# Altium footprint library etherceptor.PcbLib: 98 footprints (part 3 of 7)
Each footprint in its own frame and in the unit in brackets; x right, y up, seen from the top. Pads: shape width x height; smd on the part's side, far side on the other; paste and mask are expansions set on the pad; w line width, h text height; cw(c..) or ccw(c..) is an arc to the next point about the centre after c.
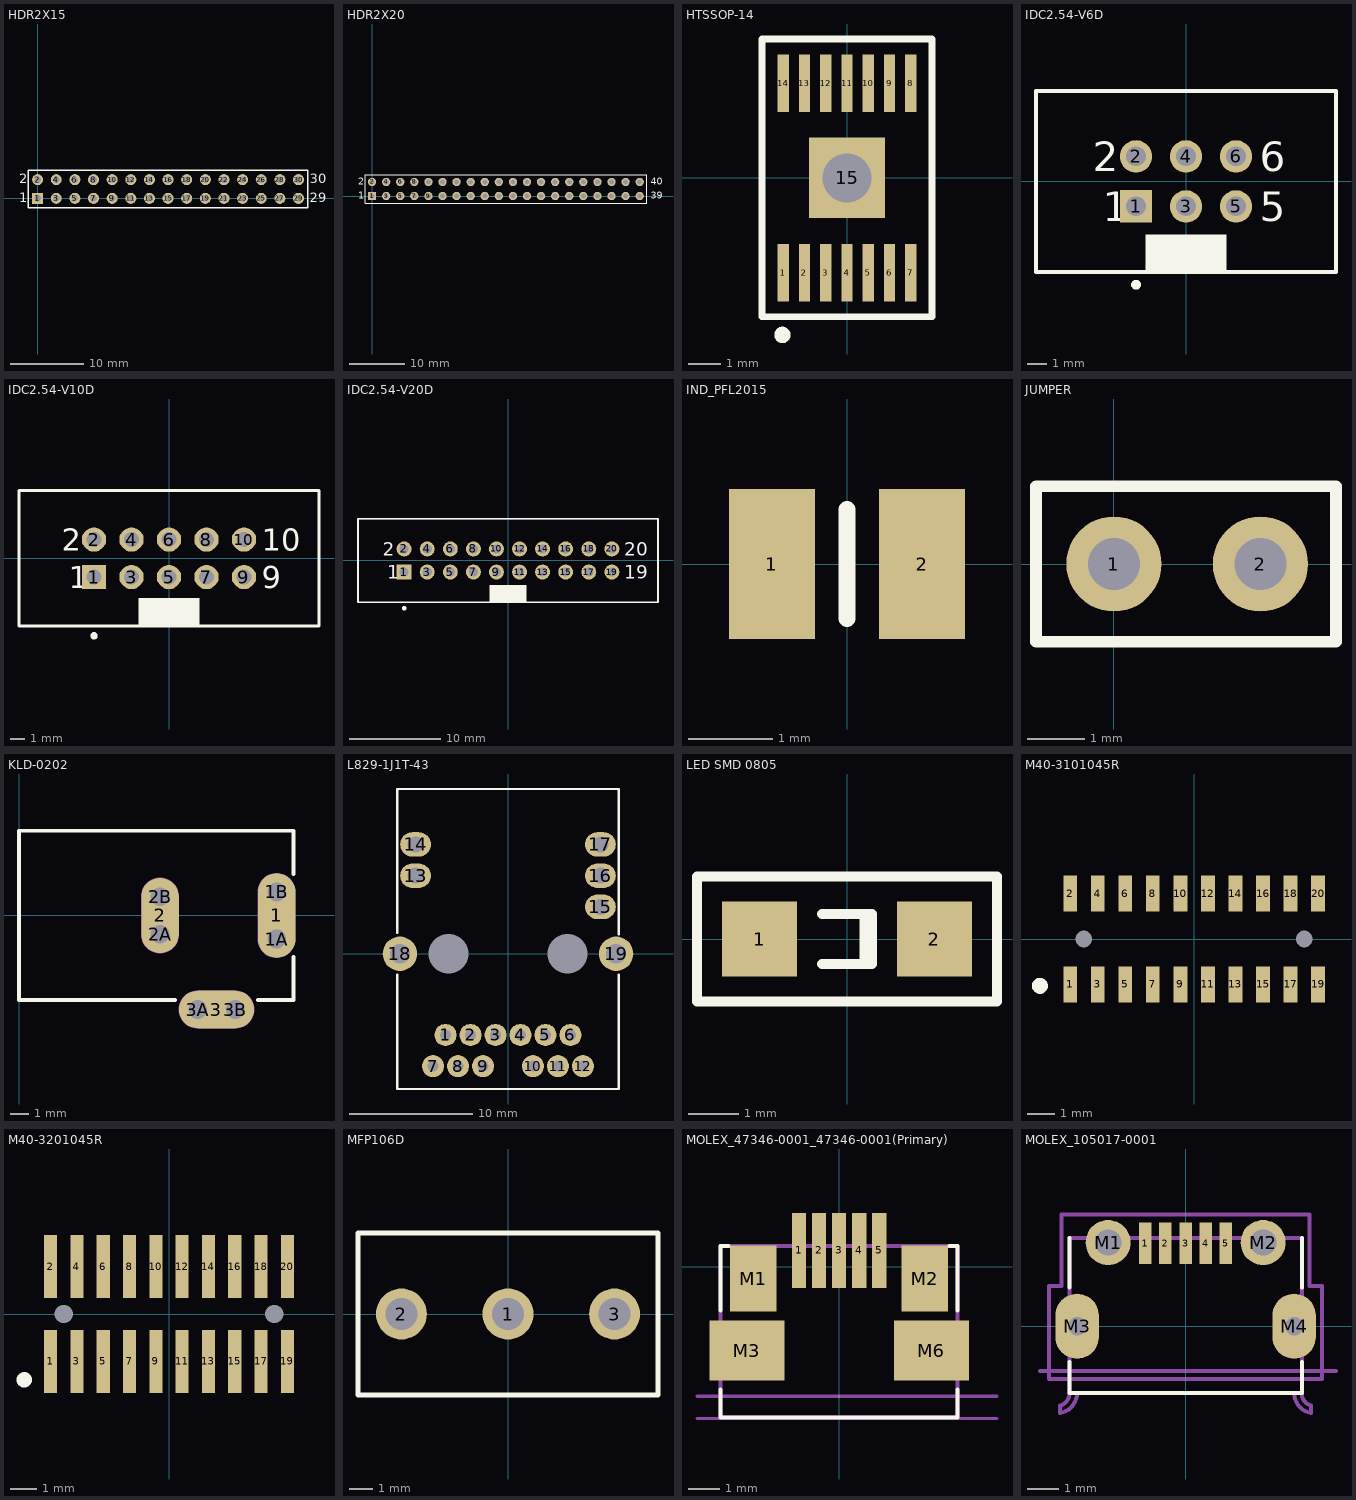
[diagram p2: the footprints below, top view; thin cyan lines are the x and y axes]

## HDR2X15 [mm] "Connector; Header; 15x2 Position"
pads (30):
  rect 1.5x1.5 hole 0.9: 1(0,0)
  round 1.5 hole 0.9: 2(0,2.54) 3(2.54,0) 4(2.54,2.54) 5(5.08,0) 6(5.08,2.54) 7(7.62,0) 8(7.62,2.54) 9(10.16,0) 10(10.16,2.54) 11(12.7,0) 12(12.7,2.54) 13(15.24,0) 14(15.24,2.54) 15(17.78,0) 16(17.78,2.54) 17(20.32,0) 18(20.32,2.54) 19(22.86,0) 20(22.86,2.54) 21(25.4,0) 22(25.4,2.54) 23(27.94,0) 24(27.94,2.54) 25(30.48,0) 26(30.48,2.54) 27(33.02,0) 28(33.02,2.54) 29(35.56,0) 30(35.56,2.54)
Top Overlay:
  lines w0.2: -1.27,-1.27 36.83,-1.27 36.83,3.81 -1.27,3.81 -1.27,-1.27
  text "1" at -2.54,-0.508 h1.27
  text "2" at -2.54,2.032 h1.27
  text "29" at 37.084,-0.508 h1.27
  text "30" at 37.084,2.032 h1.27

## HDR2X20 [mm] "Connector; Header; 20x2 Position"
pads (40):
  rect 1.5x1.5 hole 0.9: 1(0,0)
  round 1.5 hole 0.9: 2(0,2.54) 3(2.54,0) 4(2.54,2.54) 5(5.08,0) 6(5.08,2.54) 7(7.62,0) 8(7.62,2.54) 9(10.16,0) 10(10.16,2.54) 11(12.7,0) 12(12.7,2.54) 13(15.24,0) 14(15.24,2.54) 15(17.78,0) 16(17.78,2.54) 17(20.32,0) 18(20.32,2.54) 19(22.86,0) 20(22.86,2.54) 21(25.4,0) 22(25.4,2.54) 23(27.94,0) 24(27.94,2.54) 25(30.48,0) 26(30.48,2.54) 27(33.02,0) 28(33.02,2.54) 29(35.56,0) 30(35.56,2.54) 31(38.1,0) 32(38.1,2.54) 33(40.64,0) 34(40.64,2.54) 35(43.18,0) 36(43.18,2.54) 37(45.72,0) 38(45.72,2.54) 39(48.26,0) 40(48.26,2.54)
Top Overlay:
  lines w0.2: -1.27,-1.27 49.53,-1.27 49.53,3.81 -1.27,3.81 -1.27,-1.27
  text "1" at -2.54,-0.508 h1.27
  text "2" at -2.54,2.032 h1.27
  text "40" at 50.292,2.032 h1.27
  text "39" at 50.292,-0.508 h1.27

## HTSSOP-14 [mm] "HTSSOP-14 for TI TPS54226"
pads (15):
  rect 0.35x1.75 smd: 1(-1.95,-2.9) 2(-1.3,-2.9) 3(-0.65,-2.9) 4(0,-2.9) 5(0.65,-2.9) 6(1.3,-2.9) 7(1.95,-2.9) 8(1.95,2.9) 9(1.3,2.9) 10(0.65,2.9) 11(0,2.9) 12(-0.65,2.9) 13(-1.3,2.9) 14(-1.95,2.9)
  rect 2.31x2.46 hole 1.5: 15(0,0)
Top Overlay:
  circle w0.25: c-1.975,-4.8 r0.125
  lines w0.2: -2.6,-4.25 -2.6,4.25 2.6,4.25 2.6,-4.25 -2.6,-4.25
3D body "User Library-TSSOP-14.STEP": height 1.35, standoff 0, extent -2.55,-3.25 2.55,3.206

## IDC2.54-V6D [mm] "Connector; IDC, Low Profile Male Header, Thru-Hole; 6 Position; Vertical; Pitch 2.54 mm; Body 15.24 x 9.2 x 9.45 mm (LxWxH)"
height 9.45
pads (6):
  rect 1.65x1.65 hole 1: 1(-2.54,-1.27)
  round 1.65 hole 1: 2(-2.54,1.27) 3(0,-1.27) 4(0,1.27) 5(2.54,-1.27) 6(2.54,1.27)
Top Overlay:
  circle w0.25: c-2.54,-5.25 r0.125
  rectangle: -2.05,-4.6 2.05,-2.7
  lines w0.2: -7.62,-4.6 -7.62,4.6 7.62,4.6 7.62,-4.6 -7.62,-4.6
  text "2" at -4.74,0.52 h1.5
  text "1" at -4.24,-2.02 h1.5
  text "6" at 3.74,0.52 h1.5
  text "5" at 3.74,-2.02 h1.5
Mechanical 13:
  lines w0.1: -7.62,-4.6 7.62,-4.6 7.62,4.6 -7.62,4.6 -7.62,-4.6
3D body "User Library-Header-2x3.STEP": height 8.4, standoff -3, extent -3.76,-2.5 3.86,2.5

## IDC2.54-V10D [mm] "Connector; IDC, Low Profile Male Header, Thru-Hole; 10 Position; Vertical; Pitch 2.54 mm; Body 20.32 x 9.2 x 9.45 mm (LxWxH)"
height 9.45
pads (10):
  rect 1.65x1.65 hole 1: 1(-5.08,-1.27)
  round 1.65 hole 1: 2(-5.08,1.27) 3(-2.54,-1.27) 4(-2.54,1.27) 5(0,-1.27) 6(0,1.27) 7(2.54,-1.27) 8(2.54,1.27) 9(5.08,-1.27) 10(5.08,1.27)
Top Overlay:
  circle w0.25: c-5.08,-5.25 r0.125
  rectangle: -2.05,-4.6 2.05,-2.7
  lines w0.2: -10.16,-4.6 -10.16,4.6 10.16,4.6 10.16,-4.6 -10.16,-4.6
  text "2" at -7.28,0.52 h1.5
  text "1" at -6.78,-2.02 h1.5
  text "10" at 6.28,0.52 h1.5
  text "9" at 6.28,-2.02 h1.5
Mechanical 13:
  lines w0.1: -10.16,-4.6 10.16,-4.6 10.16,4.6 -10.16,4.6 -10.16,-4.6
3D body "Boxed Header 2x5.STEP": height 9.1, standoff -3, extent -10.27,-4.68 10.23,4.62

## IDC2.54-V20D [mm] "Connector; IDC, Low Profile Male Header, Thru-Hole; 20 Position; Vertical; Pitch 2.54 mm; Body 33.02 x 9.2 x 9.45 mm (LxWxH)"
height 9.45
pads (20):
  rect 1.65x1.65 hole 1: 1(-11.43,-1.27)
  round 1.65 hole 1: 2(-11.43,1.27) 3(-8.89,-1.27) 4(-8.89,1.27) 5(-6.35,-1.27) 6(-6.35,1.27) 7(-3.81,-1.27) 8(-3.81,1.27) 9(-1.27,-1.27) 10(-1.27,1.27) 11(1.27,-1.27) 12(1.27,1.27) 13(3.81,-1.27) 14(3.81,1.27) 15(6.35,-1.27) 16(6.35,1.27) 17(8.89,-1.27) 18(8.89,1.27) 19(11.43,-1.27) 20(11.43,1.27)
Top Overlay:
  circle w0.25: c-11.43,-5.25 r0.125
  rectangle: -2.05,-4.6 2.05,-2.7
  lines w0.2: -16.51,-4.6 -16.51,4.6 16.51,4.6 16.51,-4.6 -16.51,-4.6
  text "2" at -13.8,0.5 h1.5
  text "1" at -13.3,-2 h1.5
  text "20" at 12.8,0.5 h1.5
  text "19" at 12.8,-2 h1.5
Mechanical 13:
  lines w0.1: -16.51,-4.6 16.51,-4.6 16.51,4.6 -16.51,4.6 -16.51,-4.6
3D body "Samtec-IDC-2x10.STEP": height 9.27, standoff -2.92, extent -16.52,-4.75 16.5,4.724

## IND_PFL2015 [mm] "Coilcraft PFL2015"
height 1.5
pads (2):
  rect 1.02x1.78 smd: 1(-0.89,0) 2(0.89,0)
Top Overlay:
  lines w0.2: 0,-0.65 0,0.65
3D body "Coilcraft-PFL2015.STEP": height 1.49, standoff -0.01, extent -1.1,-0.725 1.1,0.725

## JUMPER [mm]
pads (2):
  round 1.65 hole 0.9: 1(0,0) 2(2.54,0)
Top Overlay:
  lines w0.2: -1.35,-1.35 -1.35,1.35 3.85,1.35 3.85,-1.35 -1.35,-1.35
3D body "User Library-Header1x2.STEP": height 8.54, standoff -2.44, extent -1.29,-1.25 3.79,1.29

## KLD-0202 [mm] "DC Power Jack, 2.5mm, KLD Series, PCB Mount"
pads (9):
  oval 2x4.5 all layers, no hole: 1(13.7,0)
  round 1.5 hole 1: 1A(13.7,-1.25) 1B(13.7,1.25) 2A(7.5,-1) 2B(7.5,1) 3A(9.5,-5) 3B(11.5,-5)
  oval 2x4 all layers, no hole: 2(7.5,0)
  oval 4x2 all layers, no hole: 3(10.5,-5)
Top Overlay:
  lines w0.2: 8.3,-4.5 0,-4.5 0,4.5 14.6,4.5 14.6,2.2 ; 12.7,-4.5 14.6,-4.5 14.6,-2.2
Top Paste:
  lines w0.254: 5.7,0.2 5.7,0 5.7,-0.3 5.7,0.4
Mechanical 1:
  lines w2.016: 7.5,-1 7.5,1 ; 9.5,-5 11.5,-5 ; 13.7,-1.25 13.7,1.25
  text "Alert PCB fab to slot details" at 0.286,6.066 h0.3
  text "Assign keep-out area to slot" at 0.286,6.566 h0.3
  text "Mech 2 - Slot cut-out" at 0.286,5.566 h0.3
  text "Mech 1 - Clearance, move to internal plane if present" at 0.286,5.066 h0.3
Mechanical 2:
  lines w1: 7.5,-1 7.5,1 ; 9.5,-5 11.5,-5 ; 13.7,-1.25 13.7,1.25
3D body "SW3dPS-Kobiconn_Lockable_DC_jack_161-0721-EX.STEP": height 11, standoff -3.5, extent -0.9,-5.1 14.4,4.256

## L829-1J1T-43 [mm] "gigabit magjack"
height 11.2
pads (21):
  round 1.8 hole 0.9: 1(-5.08,-6.604) 2(-3.048,-6.604) 3(-1.016,-6.604) 4(1.016,-6.604) 5(3.048,-6.604) 6(5.08,-6.604) 7(-6.096,-9.144) 8(-4.064,-9.144) 9(-2.032,-9.144) 10(2.032,-9.144) 11(4.064,-9.144) 12(6.096,-9.144)
  oval 2.5x2 hole 1.3: 13(-7.518,6.35) 14(-7.518,8.89) 15(7.518,3.81) 16(7.518,6.35) 17(7.518,8.89)
  round 2.8 hole 1.6: 18(-8.788,0) 19(8.788,0)
  round 0 hole 3.251 unplated: 20(-4.826,0) 21(4.826,0)
Top Overlay:
  lines w0.2: -9,-1.7 -9,-11 -7.2,-11 9,-11 9,-1.7 ; -9,1.7 -9,13.4 9,13.4 9,1.6
3D body "User Library-BEL FUSE L829-1J1T-43.STEP": height 12.52, standoff -3.85, extent -10.195,-11.062 10.155,13.5

## LED SMD 0805 [mm] "AVAGO TECHNOLOGIES HSME-C150"
pads (2):
  rect 1.5x1.5 smd: 1(-1.75,0) 2(1.75,0)
Top Overlay:
  lines w0.2: -0.5,-0.5 0.5,-0.5 0.5,0.5 -0.5,0.5 ; 0.35,-0.45 0.35,0.5 ; -3,-1.25 -3,1.25 3,1.25 3,-1.25 -3,-1.25
3D body "User Library-led_1206_red.STEP": height 1.1, standoff 0, extent -1.61,-0.8 1.61,0.8

## M40-3101045R [mm] "1mm SMD header female 2x10 positions"
height 2.25
pads (22):
  rect 0.5x1.3 smd: 1(-4.5,-1.65) 2(-4.5,1.65) 3(-3.5,-1.65) 4(-3.5,1.65) 5(-2.5,-1.65) 6(-2.5,1.65) 7(-1.5,-1.65) 8(-1.5,1.65) 9(-0.5,-1.65) 10(-0.5,1.65) 11(0.5,-1.65) 12(0.5,1.65) 13(1.5,-1.65) 14(1.5,1.65) 15(2.5,-1.65) 16(2.5,1.65) 17(3.5,-1.65) 18(3.5,1.65) 19(4.5,-1.65) 20(4.5,1.65)
  round 0.4 hole 0.6 unplated: MH1(-4,0) MH1(4,0)
Top Overlay:
  circle w0.3: c-5.6,-1.7 r0.141
3D body "m40-3101045_asm.stp": height 2.25, standoff -0.75, extent -5.2,-1.8 5.2,1.8

## M40-3201045R [mm] "1mm SMD header male 2x10 positions"
height 4
pads (22):
  rect 0.5x2.4 smd: 1(-4.5,-1.8) 2(-4.5,1.8) 3(-3.5,-1.8) 4(-3.5,1.8) 5(-2.5,-1.8) 6(-2.5,1.8) 7(-1.5,-1.8) 8(-1.5,1.8) 9(-0.5,-1.8) 10(-0.5,1.8) 11(0.5,-1.8) 12(0.5,1.8) 13(1.5,-1.8) 14(1.5,1.8) 15(2.5,-1.8) 16(2.5,1.8) 17(3.5,-1.8) 18(3.5,1.8) 19(4.5,-1.8) 20(4.5,1.8)
  round 0.4 hole 0.7 unplated: MH1(-4,0) MH1(4,0)
Top Overlay:
  circle w0.3: c-5.5,-2.5 r0.141
3D body "m40-3201045_asm.stp": height 3.8, standoff -0.5, extent -5,-2.6 5,2.6

## MFP106D [mm]
pads (3):
  round 2.2 hole 1.4: 1(0,0) 2(-4.6,0) 3(4.6,0)
Top Overlay:
  lines w0.2: -6.477,-3.5 6.477,-3.5 6.477,3.5 -6.477,3.5 -6.477,-3.5
3D body "User Library-Assem1-20.STEP": height 2.25, standoff -6.35, extent -6.5,-2.8 6.5,9.4

## MOLEX_47346-0001_47346-0001(Primary) [mil]
pads (9):
  rect 17.72x94 smd paste-1000 mask-1000: 1(-50,20) 2(-25,20) 3(0,20) 4(25,20) 5(50,20)
  rect 58.07x82.68 smd paste-1000 mask-1000: M1(-107,-15) M2(107,-15)
  rect 93.5x74.8 smd paste-1000 mask-1000: M3(-115,-105) M6(115,-105)
Top Overlay:
  lines w5: -147.64,-153.54 -147.64,-188.19 147.64,-188.19 147.64,-153.54 ; -147.64,-55.12 -147.64,25.59 -137.8,25.59 ; 137.8,25.59 147.64,25.59 147.64,-55.12
Top Paste:
  region: -41.14,-27 -41.14,67 -58.86,67 -58.86,-27
  region: -16.14,-27 -16.14,67 -33.86,67 -33.86,-27
  region: 8.86,-27 8.86,67 -8.86,67 -8.86,-27
  region: 33.86,-27 33.86,67 16.14,67 16.14,-27
  region: 58.86,-27 58.86,67 41.14,67 41.14,-27
  region: -77.96,26.34 -136.04,26.34 -136.04,-56.34 -77.96,-56.34
  region: 136.04,26.34 77.96,26.34 77.96,-56.34 136.04,-56.34
  region: -161.75,-142.4 -68.25,-142.4 -68.25,-67.6 -161.75,-67.6
  region: 68.25,-142.4 161.75,-142.4 161.75,-67.6 68.25,-67.6
Top Solder:
  region: -37.2,-30.94 -37.2,70.94 -62.8,70.94 -62.8,-30.94
  region: -12.2,-30.94 -12.2,70.94 -37.8,70.94 -37.8,-30.94
  region: 12.8,-30.94 12.8,70.94 -12.8,70.94 -12.8,-30.94
  region: 37.8,-30.94 37.8,70.94 12.2,70.94 12.2,-30.94
  region: 62.8,-30.94 62.8,70.94 37.2,70.94 37.2,-30.94
  region: -74.03,30.28 -139.97,30.28 -139.97,-60.28 -74.03,-60.28
  region: 139.97,30.28 74.03,30.28 74.03,-60.28 139.97,-60.28
  region: -165.69,-146.34 -64.31,-146.34 -64.31,-63.66 -165.69,-63.66
  region: 64.31,-146.34 165.69,-146.34 165.69,-63.66 64.31,-63.66
Mechanical 1:
  lines w3.94: -177.17,-189.37 196.85,-189.37 ; -177.17,-161.81 196.85,-161.81
  lines w5: -147.64,-188.19 -147.64,25.59 147.64,25.59 147.64,-188.19 -147.64,-188.19
3D body "User Library-micro_usb_47346-0001.STEP": height 107.09, standoff -8.66, extent -157.08,-204.72 157.1,9.06

## MOLEX_105017-0001 [mm]
pads (9):
  rect 0.4x1.35 smd paste-25.4 mask-25.4: 1(-1.3,2.675) 2(-0.65,2.675) 3(0,2.675) 4(0.65,2.675) 5(1.3,2.675)
  round 1.45 hole 0.85 mask-25.4: M1(-2.5,2.7) M2(2.5,2.7)
  oval 1.4x2.1 hole 0.6 mask-25.4: M3(-3.5,0) M4(3.5,0)
Top Overlay:
  lines w0.127: -3.75,-1.15 -3.75,-2.15 3.75,-2.15 3.75,-1.15 ; -3.75,1.25 -3.75,2.85 ; 3.75,1.25 3.75,2.85
Top Paste:
  region: 1.1,2 1.5,2 1.5,3.35 1.1,3.35
  region: 0.45,2 0.85,2 0.85,3.35 0.45,3.35
  region: -0.2,2 0.2,2 0.2,3.35 -0.2,3.35
  region: -0.85,2 -0.45,2 -0.45,3.35 -0.85,3.35
  region: -1.5,2 -1.1,2 -1.1,3.35 -1.5,3.35
Top Solder:
  region: 2.99,-0.4 3.029,-0.595 3.14,-0.76 3.305,-0.871 3.5,-0.91 3.695,-0.871 3.86,-0.76 3.971,-0.595 4.01,-0.4 4.01,0.4 3.971,0.595 3.86,0.76 3.695,0.871 3.5,0.91 3.305,0.871 3.14,0.76 3.029,0.595 2.99,0.4
  region: -4.01,-0.4 -3.971,-0.595 -3.86,-0.76 -3.695,-0.871 -3.5,-0.91 -3.305,-0.871 -3.14,-0.76 -3.029,-0.595 -2.99,-0.4 -2.99,0.4 -3.029,0.595 -3.14,0.76 -3.305,0.871 -3.5,0.91 -3.695,0.871 -3.86,0.76 -3.971,0.595 -4.01,0.4
  region: 1,1.9 1.6,1.9 1.6,3.45 1,3.45
  region: 0.35,1.9 0.95,1.9 0.95,3.45 0.35,3.45
  region: -0.3,1.9 0.3,1.9 0.3,3.45 -0.3,3.45
  region: -0.95,1.9 -0.35,1.9 -0.35,3.45 -0.95,3.45
  region: -1.6,1.9 -1,1.9 -1,3.45 -1.6,3.45
  region: 2.5,3.532 2.285,3.504 2.084,3.421 1.912,3.288 1.779,3.116 1.696,2.915 1.668,2.7 1.696,2.485 1.779,2.284 1.912,2.112 2.084,1.979 2.285,1.896 2.5,1.868 2.715,1.896 2.916,1.979 3.088,2.112 3.221,2.284 3.304,2.485 3.332,2.7 3.304,2.915 3.221,3.116 3.088,3.288 2.916,3.421 2.715,3.504
  region: -2.5,3.532 -2.715,3.504 -2.916,3.421 -3.088,3.288 -3.221,3.116 -3.304,2.915 -3.332,2.7 -3.304,2.485 -3.221,2.284 -3.088,2.112 -2.916,1.979 -2.715,1.896 -2.5,1.868 -2.285,1.896 -2.084,1.979 -1.912,2.112 -1.779,2.284 -1.696,2.485 -1.668,2.7 -1.696,2.915 -1.779,3.116 -1.912,3.288 -2.084,3.421 -2.285,3.504
Bottom Solder:
  region: 2.99,-0.4 3.029,-0.595 3.14,-0.76 3.305,-0.871 3.5,-0.91 3.695,-0.871 3.86,-0.76 3.971,-0.595 4.01,-0.4 4.01,0.4 3.971,0.595 3.86,0.76 3.695,0.871 3.5,0.91 3.305,0.871 3.14,0.76 3.029,0.595 2.99,0.4
  region: -4.01,-0.4 -3.971,-0.595 -3.86,-0.76 -3.695,-0.871 -3.5,-0.91 -3.305,-0.871 -3.14,-0.76 -3.029,-0.595 -2.99,-0.4 -2.99,0.4 -3.029,0.595 -3.14,0.76 -3.305,0.871 -3.5,0.91 -3.695,0.871 -3.86,0.76 -3.971,0.595 -4.01,0.4
  region: 2.5,3.532 2.285,3.504 2.084,3.421 1.912,3.288 1.779,3.116 1.696,2.915 1.668,2.7 1.696,2.485 1.779,2.284 1.912,2.112 2.084,1.979 2.285,1.896 2.5,1.868 2.715,1.896 2.916,1.979 3.088,2.112 3.221,2.284 3.304,2.485 3.332,2.7 3.304,2.915 3.221,3.116 3.088,3.288 2.916,3.421 2.715,3.504
  region: -2.5,3.532 -2.715,3.504 -2.916,3.421 -3.088,3.288 -3.221,3.116 -3.304,2.915 -3.332,2.7 -3.304,2.485 -3.221,2.284 -3.088,2.112 -2.916,1.979 -2.715,1.896 -2.5,1.868 -2.285,1.896 -2.084,1.979 -1.912,2.112 -1.779,2.284 -1.696,2.485 -1.668,2.7 -1.696,2.915 -1.779,3.116 -1.912,3.288 -2.084,3.421 -2.285,3.504
Mechanical 1:
  lines w0: -3.8,-0.35 ccw(c-3.5,-0.35) -3.2,-0.35 -3.2,0.35 ccw(c-3.5,0.35) -3.8,0.35 -3.8,-0.35 ; 3.2,-0.35 ccw(c3.5,-0.35) 3.8,-0.35 3.8,0.35 ccw(c3.5,0.35) 3.2,0.35 3.2,-0.35
  lines w0.127: -4.7,-1.45 4.85,-1.45 ; -4.05,-2.8 -4.05,-2.55 ; -4.049,-2.55 ccw(c-4.128,-2.179) -3.75,-2.153 ; -4.047,-2.8 ccw(c-4.162,-2.147) -3.5,-2.147 ; -3.75,-2.15 -3.75,2.85 3.75,2.85 3.75,-2.15 ; 3.5,-2.147 ccw(c4.162,-2.147) 4.047,-2.8 ; 3.75,-2.153 ccw(c4.128,-2.179) 4.049,-2.55 ; 4.05,-2.8 4.05,-2.55 ; -4.4,-1.7 4.4,-1.7 4.4,1.3 4,1.3 4,3.6 -4,3.6 -4,1.3 -4.4,1.3 -4.4,-1.7
Mechanical 2:
  lines w0.6: -3.5,-0.35 -3.5,0.35 ; 3.5,-0.35 3.5,0.35
3D body "1050170001.stp": height 2.68, standoff -0.63, extent -4.1,-2.525 4.1,2.875